# Altium footprint library Sensors.PcbLib: 30 footprints (part 2 of 2)
Each footprint in its own frame and in the unit in brackets; x right, y up, seen from the top. Pads: shape width x height; smd on the part's side, far side on the other; paste and mask are expansions set on the pad; w line width, h text height; cw(c..) or ccw(c..) is an arc to the next point about the centre after c.
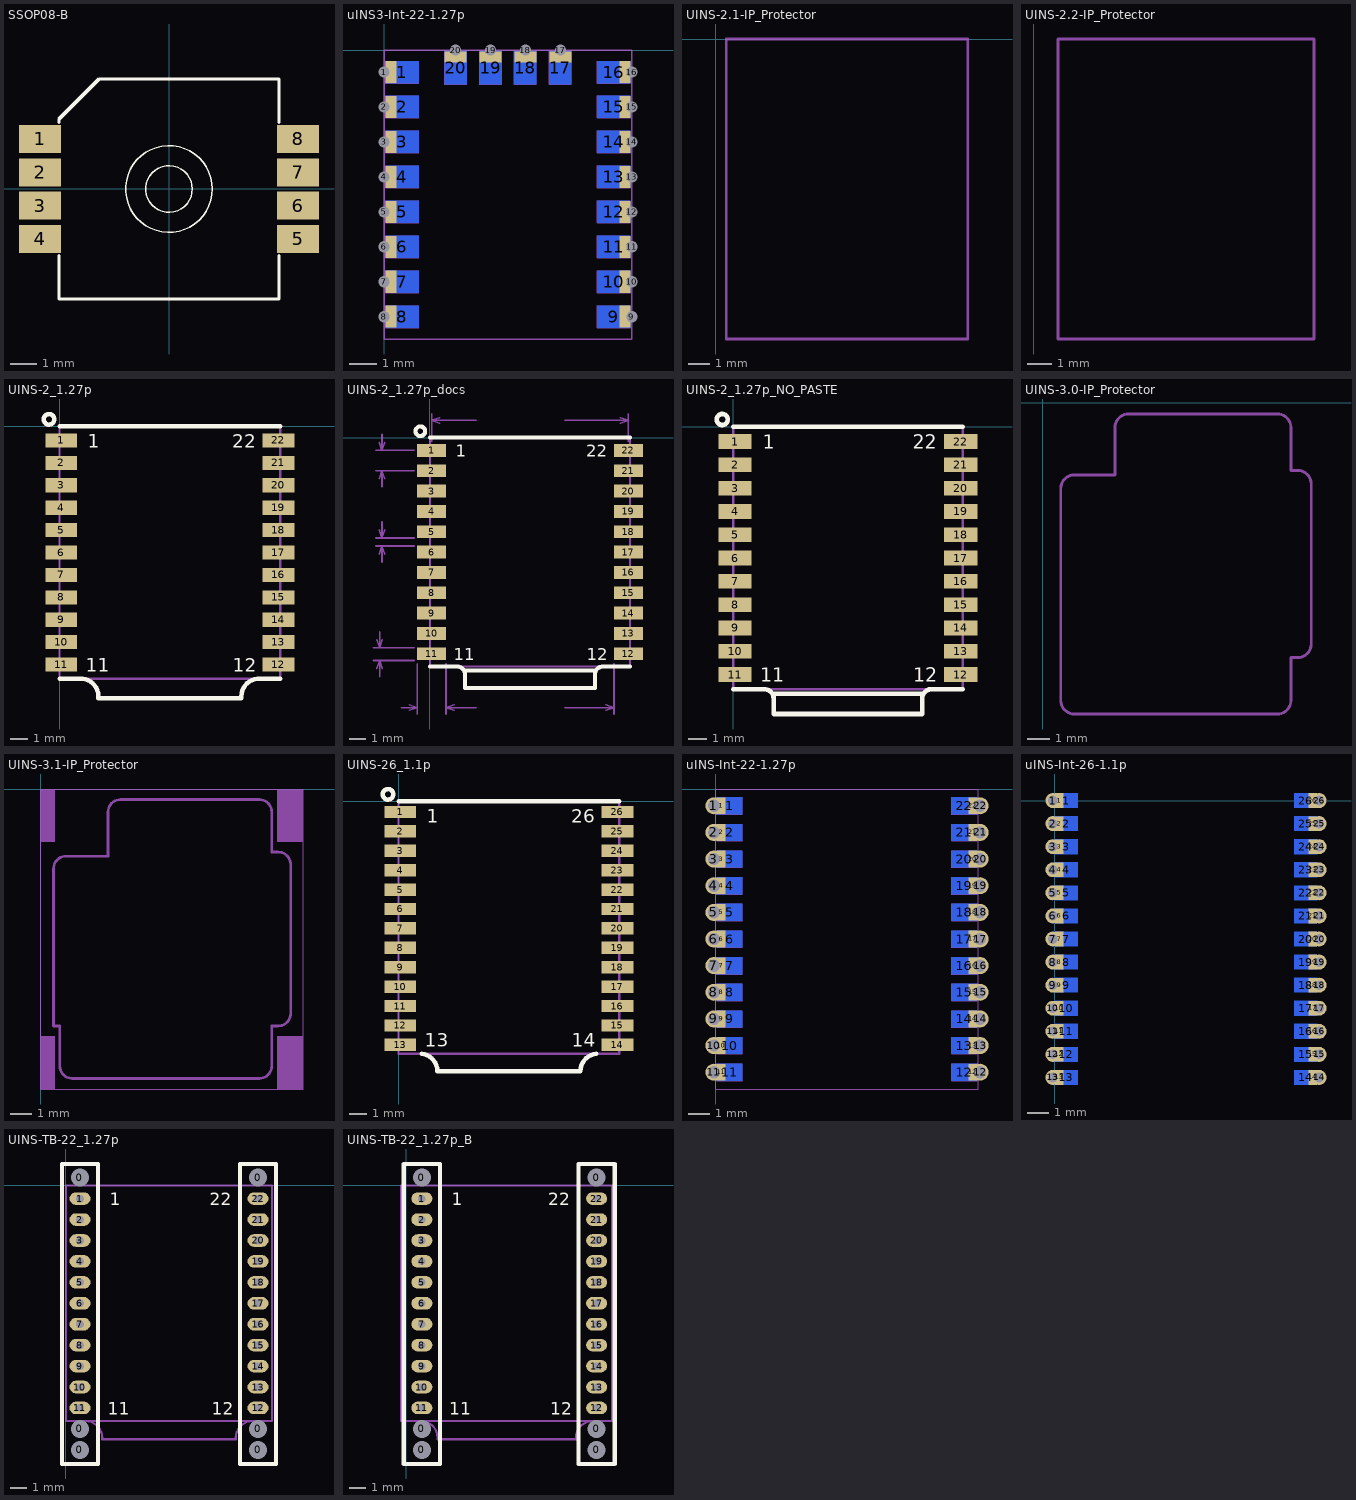
[diagram p1: the footprints below, top view; thin cyan lines are the x and y axes]

## SSOP08-B [mil] "Single Port Pressure Sensor"
pads (8):
  rect 63x42 smd paste-6.69 mask-6.3: 1(-193.5,75) 2(-193.5,25) 3(-193.5,-25) 4(-193.5,-75) 5(193.5,-75) 6(193.5,-25) 7(193.5,25) 8(193.5,75)
Top Overlay:
  circle w1.97: c0,0 r65
  circle w1.97: c0,0 r35
  lines w5: -165,-100 -165,-165 165,-165 165,-100 ; -165,100 -165,105 -105,165 165,165 165,100
3D body: height 190, standoff 0, extent -168.02,-168.02 168.02,168.02
3D body: height 380, standoff 0, extent -64.98,-64.98 64.98,64.98

## uINS3-Int-22-1.27p [mm] "uINS Interface, 22 pins 1.27mm pitch"
pads (40):
  rect 0.4x0.8 hole 0.406 copper offset 0.25,0: 1(0,-0.8) 2(0,-2.07) 3(0,-3.34) 4(0,-4.61) 5(0,-5.88) 6(0,-7.15) 7(0,-8.42) 8(0,-9.69)
  rect 1.2x0.8 smd far side paste-2: 1(0.65,-0.8) 2(0.65,-2.07) 3(0.65,-3.34) 4(0.65,-4.61) 5(0.65,-5.88) 6(0.65,-7.15) 7(0.65,-8.42) 8(0.65,-9.69) 9(8.35,-9.69) 10(8.35,-8.42) 11(8.35,-7.15) 12(8.35,-5.88) 13(8.35,-4.61) 14(8.35,-3.34) 15(8.35,-2.07) 16(8.35,-0.8)
  rect 0.4x0.8 hole 0.406 copper offset -0.25,0: 9(9,-9.69) 10(9,-8.42) 11(9,-7.15) 12(9,-5.88) 13(9,-4.61) 14(9,-3.34) 15(9,-2.07) 16(9,-0.8)
  rect 0.8x1.2 smd far side paste-2: 17(6.405,-0.65) 18(5.135,-0.65) 19(3.865,-0.65) 20(2.595,-0.65)
  rect 0.8x0.4 hole 0.406 copper offset 0,-0.25: 17(6.405,0) 18(5.135,0) 19(3.865,0) 20(2.595,0)
Mechanical 13:
  lines w0.05: 0,-10.5 0,0 9,0 9,-10.5 0,-10.5
Dimensions:
  lines w0.025: 0.05,-10.09 0.05,-9.89 ccw(c0,-9.69) 0.05,-9.49 0.05,-9.29 1.25,-9.29 1.25,-10.09 0.05,-10.09 ; 0.05,-8.82 1.25,-8.82 1.25,-8.02 0.05,-8.02 0.05,-8.22 cw(c0,-8.42) 0.05,-8.62 0.05,-8.82 ; 0.05,-7.55 1.25,-7.55 1.25,-6.75 0.05,-6.75 0.05,-6.95 cw(c0,-7.15) 0.05,-7.35 0.05,-7.55 ; 0.05,-6.28 1.25,-6.28 1.25,-5.48 0.05,-5.48 0.05,-5.68 cw(c0,-5.88) 0.05,-6.08 0.05,-6.28 ; 0.05,-5.01 1.25,-5.01 1.25,-4.21 0.05,-4.21 0.05,-4.41 cw(c0,-4.61) 0.05,-4.81 0.05,-5.01 ; 0.05,-3.74 1.25,-3.74 1.25,-2.94 0.05,-2.94 0.05,-3.14 cw(c0,-3.34) 0.05,-3.54 0.05,-3.74 ; 0.05,-2.47 1.25,-2.47 1.25,-1.67 0.05,-1.67 0.05,-1.87 cw(c0,-2.07) 0.05,-2.27 0.05,-2.47 ; 0.05,-1.2 0.05,-1 ccw(c0,-0.8) 0.05,-0.6 0.05,-0.4 1.25,-0.4 1.25,-1.2 0.05,-1.2 ; 2.195,-1.25 2.995,-1.25 2.995,-0.05 2.795,-0.05 cw(c2.595,0) 2.395,-0.05 2.195,-0.05 2.195,-1.25 ; 3.465,-1.25 4.265,-1.25 4.265,-0.05 4.065,-0.05 cw(c3.865,0) 3.665,-0.05 3.465,-0.05 3.465,-1.25 ; 4.735,-1.25 5.535,-1.25 5.535,-0.05 5.335,-0.05 cw(c5.135,0) 4.935,-0.05 4.735,-0.05 4.735,-1.25 ; 6.005,-1.25 6.005,-0.05 6.205,-0.05 ccw(c6.405,0) 6.605,-0.05 6.805,-0.05 6.805,-1.25 6.005,-1.25 ; 7.75,-10.09 7.75,-9.29 8.95,-9.29 8.95,-9.49 ccw(c9,-9.69) 8.95,-9.89 8.95,-10.09 7.75,-10.09 ; 7.75,-8.82 7.75,-8.02 8.95,-8.02 8.95,-8.22 ccw(c9,-8.42) 8.95,-8.62 8.95,-8.82 7.75,-8.82 ; 7.75,-7.55 7.75,-6.75 8.95,-6.75 8.95,-6.95 ccw(c9,-7.15) 8.95,-7.35 8.95,-7.55 7.75,-7.55 ; 7.75,-6.28 8.95,-6.28 8.95,-6.08 cw(c9,-5.88) 8.95,-5.68 8.95,-5.48 7.75,-5.48 7.75,-6.28 ; 7.75,-5.01 8.95,-5.01 8.95,-4.81 cw(c9,-4.61) 8.95,-4.41 8.95,-4.21 7.75,-4.21 7.75,-5.01 ; 7.75,-3.74 8.95,-3.74 8.95,-3.54 cw(c9,-3.34) 8.95,-3.14 8.95,-2.94 7.75,-2.94 7.75,-3.74 ; 7.75,-2.47 8.95,-2.47 8.95,-2.27 cw(c9,-2.07) 8.95,-1.87 8.95,-1.67 7.75,-1.67 7.75,-2.47 ; 7.75,-1.2 8.95,-1.2 8.95,-1 cw(c9,-0.8) 8.95,-0.6 8.95,-0.4 7.75,-0.4 7.75,-1.2

## UINS-2.1-IP_Protector [mm] "Inerial Sense Miniature INS IP Protector"
height 6.5
Mechanical 13:
  lines w0.127: 0.5,-14.3 0.5,0 1.7,0 10.8,0 12,0 12,-14.3 10.8,-14.3 0.5,-14.3
3D body: height 4, standoff 0, extent 0.501,-14.299 11.999,-0.001

## UINS-2.2-IP_Protector [mm] "Inerial Sense Miniature INS IP Protector"
height 6.5
Mechanical 13:
  lines w0.127: 1,-13.3 1,-1 11.5,-1 11.5,-13.3 1,-13.3
3D body: height 2.5, standoff 0, extent 1,-13.3 11.5,-1

## UINS-2_1.27p [mm] "Inerial Sense Miniature INS, 22pins 1.27mm pitch"
height 6.5
pads (22):
  rect 1.8x0.8 smd paste-0.1: 1(0.1,-0.8) 2(0.1,-2.07) 3(0.1,-3.34) 4(0.1,-4.61) 5(0.1,-5.88) 6(0.1,-7.15) 7(0.1,-8.42) 8(0.1,-9.69) 9(0.1,-10.96) 10(0.1,-12.23) 11(0.1,-13.5) 12(12.4,-13.5) 13(12.4,-12.23) 14(12.4,-10.96) 15(12.4,-9.69) 16(12.4,-8.42) 17(12.4,-7.15) 18(12.4,-5.88) 19(12.4,-4.61) 20(12.4,-3.34) 21(12.4,-2.07) 22(12.4,-0.8)
Top Overlay:
  circle w0.254: c-0.6,0.4 r0.3
  lines w0.254: 0,-14.3 1.3,-14.3 ; 0,0 12.5,0 ; 1.3,-14.305 cw(c1.2,-15.3) 2.2,-15.3 2.2,-15.4 10.3,-15.4 10.3,-15.3 cw(c11.3,-15.3) 11.2,-14.305 12.5,-14.305
  text "1" at 1.6,-1.2 h0.76
  text "11" at 1.473,-13.9 h0.76
  text "12" at 9.8,-13.9 h0.76
  text "22" at 9.773,-1.2 h0.76
Top Paste:
  rectangle: -0.8,-1.15 0,-0.45
  rectangle: -0.8,-2.42 0,-1.72
  rectangle: -0.8,-3.69 0,-2.99
  rectangle: -0.8,-4.96 0,-4.26
  rectangle: -0.8,-6.23 0,-5.53
  rectangle: -0.8,-7.5 0,-6.8
  rectangle: -0.8,-8.77 0,-8.07
  rectangle: -0.8,-10.04 0,-9.34
  rectangle: -0.8,-11.31 0,-10.61
  rectangle: -0.8,-12.58 0,-11.88
  rectangle: -0.8,-13.85 0,-13.15
  region: 13.3,-13.15 12.5,-13.15 12.5,-13.85 13.3,-13.85
  region: 13.3,-10.61 12.5,-10.61 12.5,-11.31 13.3,-11.31
  region: 13.3,-9.34 12.5,-9.34 12.5,-10.04 13.3,-10.04
  region: 13.3,-8.07 12.5,-8.07 12.5,-8.77 13.3,-8.77
  region: 13.3,-6.8 12.5,-6.8 12.5,-7.5 13.3,-7.5
  region: 13.3,-5.53 12.5,-5.53 12.5,-6.23 13.3,-6.23
  region: 13.3,-4.26 12.5,-4.26 12.5,-4.96 13.3,-4.96
  region: 13.3,-2.99 12.5,-2.99 12.5,-3.69 13.3,-3.69
  region: 13.3,-1.72 12.5,-1.72 12.5,-2.42 13.3,-2.42
  region: 13.3,-0.45 12.5,-0.45 12.5,-1.15 13.3,-1.15
  region: 13.3,-11.88 12.5,-11.88 12.5,-12.58 13.3,-12.58
Mechanical 13:
  lines w0.127: 0,-14.3 12.5,-14.3 ; 0,-14.3 0,0 12.5,0 12.5,-14.3 ; 0,-14.3 1.2,-14.3 cw(c1.2,-15.3) 2.2,-15.3 2.2,-15.4 10.3,-15.4 10.3,-15.3 cw(c11.3,-15.3) 11.3,-14.3 12.5,-14.3
3D body "uINS.step": height 6.62, standoff 0.01, extent 0,-15.4 12.5,0

## UINS-2_1.27p_docs [mm] "Inerial Sense Miniature INS, 22pins 1.27mm pitch"
height 6.5
pads (22):
  rect 1.8x0.8 smd paste-2: 1(0.1,-0.8) 2(0.1,-2.07) 3(0.1,-3.34) 4(0.1,-4.61) 5(0.1,-5.88) 6(0.1,-7.15) 7(0.1,-8.42) 8(0.1,-9.69) 9(0.1,-10.96) 10(0.1,-12.23) 11(0.1,-13.5) 12(12.4,-13.5) 13(12.4,-12.23) 14(12.4,-10.96) 15(12.4,-9.69) 16(12.4,-8.42) 17(12.4,-7.15) 18(12.4,-5.88) 19(12.4,-4.61) 20(12.4,-3.34) 21(12.4,-2.07) 22(12.4,-0.8)
Top Overlay:
  circle w0.254: c-0.6,0.4 r0.3
  lines w0.254: 0,-14.3 1.7,-14.3 cw(c1.7,-14.8) 2.2,-14.8 2.2,-15.65 10.3,-15.65 10.3,-14.8 cw(c10.8,-14.8) 10.75,-14.302 ; 0,0 12.5,0 ; 2.2,-14.55 10.3,-14.55 ; 10.8,-14.3 12.5,-14.3
  text "22" at 9.773,-1.2 h0.76
  text "12" at 9.8,-13.9 h0.76
  text "11" at 1.473,-13.9 h0.76
  text "1" at 1.6,-1.2 h0.76
Mechanical 13:
  lines w0.1: 1.2,-14.3 0,-14.3 ; 1.7,-14.3 cw(c1.7,-14.8) 2.2,-14.8 2.2,-15.65 10.3,-15.65 10.3,-14.8 cw(c10.8,-14.8) 10.8,-14.3 ; 2.2,-14.55 10.3,-14.55 ; 11.3,-14.3 12.5,-14.3 ; 0,-14.3 0,0 12.5,0 12.5,-14.3 ; 0,-14.3 12.5,-14.3
Dimensions:
  lines w0.1: -3.548,-13.923 -0.998,-13.923 ; -3.548,-13.123 -0.998,-13.123 ; -3.398,-6.773 -0.998,-6.773 ; -3.398,-6.273 -0.998,-6.273 ; -3.398,-2.07 -1,-2.07 ; -3.398,-0.8 -1,-0.8 ; -3.315,-14.423 -3.148,-13.923 ; -3.315,-12.623 -3.148,-13.123 ; -3.165,-7.273 -2.998,-6.773 ; -3.165,-5.773 -2.998,-6.273 ; -3.165,-2.57 -2.998,-2.07 ; -3.165,-0.3 -2.998,-0.8 ; -3.148,-14.923 -3.148,-13.923 ; -3.148,-12.123 -3.148,-13.123 ; -2.998,-7.773 -2.998,-6.773 ; -2.998,-5.273 -2.998,-6.273 ; -2.998,-3.07 -2.998,-2.07 ; -2.998,0.2 -2.998,-0.8 ; -2.981,-14.423 -3.148,-13.923 ; -2.981,-12.623 -3.148,-13.123 ; -2.831,-7.273 -2.998,-6.773 ; -2.831,-5.773 -2.998,-6.273 ; -2.831,-2.57 -2.998,-2.07 ; -2.831,-0.3 -2.998,-0.8 ; -1.798,-16.867 -0.798,-16.867 ; -1.298,-17.034 -0.798,-16.867 ; -1.298,-16.7 -0.798,-16.867 ; -0.798,-17.267 -0.798,-14.123 ; 0.1,-0.269 0.1,1.477 ; 0.6,0.91 0.1,1.077 ; 0.6,1.244 0.1,1.077 ; 1.002,-17.267 1.002,-15.623 ; 1.002,-15.767 1.002,-14.123 ; 2.002,-16.867 1.002,-16.867 ; 2.884,1.077 0.1,1.077 ; 2.886,-16.867 1.002,-16.867 ; 8.416,1.077 12.4,1.077 ; 8.418,-16.867 11.502,-16.867 ; 11.002,-17.034 11.502,-16.867 ; 11.002,-16.7 11.502,-16.867 ; 11.502,-17.267 11.502,-14.123 ; 11.9,0.91 12.4,1.077 ; 11.9,1.244 12.4,1.077 ; 12.4,-0.269 12.4,1.477 ; 1.002,-16.867 1.502,-17.034 1.002,-16.867 ; 1.002,-16.867 1.502,-16.7 1.002,-16.867
  text "0.50" at -4.198,-8.872 h1
  text "1.27" at -4.198,-3.701 h1
  text "1.80" at -2.164,-19.266 h1
  text "0.80" at -4.348,-15.872 h1
  text "12.30" at 3.484,0.477 h1
  text "10.50" at 3.486,-17.467 h1
3D body "uINS_no_passives(IS-uINS-r2.1.1).step": height 6.63, standoff 0.01, extent 0,-15.74 12.5,0

## UINS-2_1.27p_NO_PASTE [mm] "Inerial Sense Miniature INS, 22pins 1.27mm pitch"
height 6.5
pads (22):
  rect 1.8x0.8 smd paste-2: 1(0.1,-0.8) 2(0.1,-2.07) 3(0.1,-3.34) 4(0.1,-4.61) 5(0.1,-5.88) 6(0.1,-7.15) 7(0.1,-8.42) 8(0.1,-9.69) 9(0.1,-10.96) 10(0.1,-12.23) 11(0.1,-13.5) 12(12.4,-13.5) 13(12.4,-12.23) 14(12.4,-10.96) 15(12.4,-9.69) 16(12.4,-8.42) 17(12.4,-7.15) 18(12.4,-5.88) 19(12.4,-4.61) 20(12.4,-3.34) 21(12.4,-2.07) 22(12.4,-0.8)
Top Overlay:
  circle w0.254: c-0.6,0.4 r0.3
  lines w0.254: 0,-14.3 1.7,-14.3 cw(c1.7,-14.8) 2.2,-14.8 2.2,-15.65 10.3,-15.65 10.3,-14.8 cw(c10.8,-14.8) 10.75,-14.302 ; 0,0 12.5,0 ; 2.2,-14.55 10.3,-14.55 ; 10.8,-14.3 12.5,-14.3
  text "1" at 1.6,-1.2 h0.76
  text "11" at 1.473,-13.9 h0.76
  text "12" at 9.8,-13.9 h0.76
  text "22" at 9.773,-1.2 h0.76
Mechanical 13:
  lines w0.127: 1.2,-14.3 0,-14.3 ; 1.7,-14.3 cw(c1.7,-14.8) 2.2,-14.8 2.2,-15.65 10.3,-15.65 10.3,-14.8 cw(c10.8,-14.8) 10.8,-14.3 ; 2.2,-14.55 10.3,-14.55 ; 11.3,-14.3 12.5,-14.3 ; 0,-14.3 12.5,-14.3 ; 0,-14.3 0,0 12.5,0 12.5,-14.3
3D body "uINS_no_passives(IS-uINS-r2.1.1).step": height 6.63, standoff 0.01, extent 0,-15.74 12.5,0

## UINS-3.0-IP_Protector [mm] "Inerial Sense Miniature INS IP Protector"
height 2
Mechanical 13:
  lines w0.127: 0.8,-13.2 ccw(c1.4,-13.2) 1.4,-13.8 10.4,-13.8 ccw(c10.4,-13.2) 11,-13.2 11,-11.3 11.3,-11.3 ccw(c11.3,-10.7) 11.9,-10.7 11.9,-3.6 ccw(c11.3,-3.6) 11.3,-3 11,-3 11,-1.1 ccw(c10.4,-1.1) 10.4,-0.5 3.8,-0.5 ccw(c3.8,-1.1) 3.2,-1.1 3.2,-3.2 1.4,-3.2 ccw(c1.4,-3.8) 0.8,-3.8 0.8,-13.2
3D body: height 2, standoff 0, extent 0.799,-13.801 11.901,-0.499

## UINS-3.1-IP_Protector [mm] "Inerial Sense Miniature INS IP Protector"
height 2
Mechanical 13:
  region: 0,-11.785 0,-14.3 0.66,-14.3 0.66,-11.785
  region: 0.66,-2.515 0.66,0 0,0 0,-2.515
  region: 11.255,0 11.255,-2.515 12.5,-2.515 12.5,0
  region: 11.255,-11.785 11.255,-14.3 12.5,-14.3 12.5,-11.785
  lines w0.051: 0,-14.3 0,0 12.5,0 12.5,-14.3 0,-14.3
  lines w0.127: 0.6,-11.3 0.6,-3.8 cw(c1.2,-3.8) 1.2,-3.2 3.2,-3.2 3.2,-1.1 cw(c3.8,-1.1) 3.8,-0.5 10.4,-0.5 cw(c10.4,-1.1) 11,-1.1 11,-3 11.3,-3 cw(c11.3,-3.6) 11.9,-3.6 11.9,-10.7 cw(c11.3,-10.7) 11.3,-11.3 11,-11.3 11,-13.2 cw(c10.4,-13.2) 10.4,-13.8 1.5,-13.8 cw(c1.5,-13.2) 0.9,-13.2 0.9,-11.6 0.9,-11.3 0.6,-11.3
3D body: height 2, standoff 0, extent 0.599,-13.801 11.901,-0.499

## UINS-26_1.1p [mm] "Inerial Sense Miniature INS, 26 pins 1.1mm pitch"
height 6.5
pads (26):
  rect 1.8x0.7 smd paste-0.1: 1(0.1,-0.6) 14(12.4,-13.8) 15(12.4,-12.7) 16(12.4,-11.6) 17(12.4,-10.5) 18(12.4,-9.4) 19(12.4,-8.3) 20(12.4,-7.2) 21(12.4,-6.1) 22(12.4,-5) 23(12.4,-3.9) 24(12.4,-2.8) 25(12.4,-1.7) 26(12.4,-0.6)
  rect 1.8x0.7 smd paste-2: 2(0.1,-1.7) 3(0.1,-2.8) 4(0.1,-3.9) 5(0.1,-5) 6(0.1,-6.1) 7(0.1,-7.2) 8(0.1,-8.3) 9(0.1,-9.4) 10(0.1,-10.5) 11(0.1,-11.6) 12(0.1,-12.7) 13(0.1,-13.8)
Top Overlay:
  circle w0.254: c-0.6,0.4 r0.3
  lines w0.254: 0,0 12.5,0 ; 1.3,-14.305 cw(c1.2,-15.3) 2.2,-15.3 10.3,-15.3 cw(c11.3,-15.3) 11.2,-14.305
  text "26" at 9.773,-1.2 h0.76
  text "14" at 9.8,-13.9 h0.76
  text "13" at 1.473,-13.9 h0.76
  text "1" at 1.6,-1.2 h0.76
Top Paste:
  region: 13.3,-0.25 12.5,-0.25 12.5,-0.95 13.3,-0.95
  region: 13.3,-1.35 12.5,-1.35 12.5,-2.05 13.3,-2.05
  rectangle: 0,-14.05 0.9,-13.55
  rectangle: -0.8,-14.15 0,-13.45
  region: 13.3,-2.45 12.5,-2.45 12.5,-3.15 13.3,-3.15
  region: 13.3,-3.55 12.5,-3.55 12.5,-4.25 13.3,-4.25
  region: 13.3,-4.65 12.5,-4.65 12.5,-5.35 13.3,-5.35
  region: 13.3,-5.75 12.5,-5.75 12.5,-6.45 13.3,-6.45
  region: 13.3,-6.85 12.5,-6.85 12.5,-7.55 13.3,-7.55
  region: 13.3,-7.95 12.5,-7.95 12.5,-8.65 13.3,-8.65
  region: 13.3,-9.05 12.5,-9.05 12.5,-9.75 13.3,-9.75
  region: 13.3,-10.15 12.5,-10.15 12.5,-10.85 13.3,-10.85
  region: 13.3,-11.25 12.5,-11.25 12.5,-11.95 13.3,-11.95
  region: 13.3,-12.35 12.5,-12.35 12.5,-13.05 13.3,-13.05
  region: 13.3,-13.45 12.5,-13.45 12.5,-14.15 13.3,-14.15
  rectangle: -0.8,-13.05 0,-12.35
  rectangle: 0,-12.95 0.9,-12.45
  rectangle: -0.8,-11.95 0,-11.25
  rectangle: 0,-11.85 0.9,-11.35
  rectangle: -0.8,-10.85 0,-10.15
  rectangle: 0,-10.75 0.9,-10.25
  rectangle: -0.8,-9.75 0,-9.05
  rectangle: 0,-9.65 0.9,-9.15
  rectangle: -0.8,-8.65 0,-7.95
  rectangle: 0,-8.55 0.9,-8.05
  rectangle: -0.8,-7.55 0,-6.85
  rectangle: 0,-7.45 0.9,-6.95
  rectangle: -0.8,-6.45 0,-5.75
  rectangle: 0,-6.35 0.9,-5.85
  rectangle: -0.8,-5.35 0,-4.65
  rectangle: 0,-5.25 0.9,-4.75
  rectangle: -0.8,-4.25 0,-3.55
  rectangle: 0,-4.15 0.9,-3.65
  rectangle: -0.8,-3.15 0,-2.45
  rectangle: 0,-3.05 0.9,-2.55
  rectangle: -0.8,-2.05 0,-1.35
  rectangle: 0,-1.95 0.9,-1.45
  rectangle: -0.8,-0.95 0,-0.25
Mechanical 13:
  lines w0.127: 0,-14.3 1.2,-14.3 cw(c1.2,-15.3) 2.2,-15.3 10.3,-15.3 cw(c11.3,-15.3) 11.3,-14.3 12.5,-14.3 ; 0,-14.3 0,0 12.5,0 12.5,-14.3 ; 0,-14.3 12.5,-14.3

## uINS-Int-22-1.27p [mm] "uINS Interface, 22 pins 1.27mm pitch"
pads (66):
  round 0.813 hole 0.584 mask-0.051: 1(-0.09,-0.8) 2(-0.09,-2.07) 3(-0.09,-3.34) 4(-0.09,-4.61) 5(-0.09,-5.88) 6(-0.09,-7.15) 7(-0.09,-8.42) 8(-0.09,-9.69) 9(-0.09,-10.96) 10(-0.09,-12.23) 11(-0.09,-13.5) 12(12.59,-13.5) 13(12.59,-12.23) 14(12.59,-10.96) 15(12.59,-9.69) 16(12.59,-8.42) 17(12.59,-7.15) 18(12.59,-5.88) 19(12.59,-4.61) 20(12.59,-3.34) 21(12.59,-2.07) 22(12.59,-0.8)
  rect 0.4x0.8 smd paste-2 mask+0.038: 1(0.25,-0.8) 2(0.25,-2.07) 3(0.25,-3.34) 4(0.25,-4.61) 5(0.25,-5.88) 6(0.25,-7.15) 7(0.25,-8.42) 8(0.25,-9.69) 9(0.25,-10.96) 10(0.25,-12.23) 11(0.25,-13.5) 12(12.25,-13.5) 13(12.25,-12.23) 14(12.25,-10.96) 15(12.25,-9.69) 16(12.25,-8.42) 17(12.25,-7.15) 18(12.25,-5.88) 19(12.25,-4.61) 20(12.25,-3.34) 21(12.25,-2.07) 22(12.25,-0.8)
  rect 1.2x0.8 smd far side paste-2: 1(0.65,-0.8) 2(0.65,-2.07) 3(0.65,-3.34) 4(0.65,-4.61) 5(0.65,-5.88) 6(0.65,-7.15) 7(0.65,-8.42) 8(0.65,-9.69) 9(0.65,-10.96) 10(0.65,-12.23) 11(0.65,-13.5) 12(11.85,-13.5) 13(11.85,-12.23) 14(11.85,-10.96) 15(11.85,-9.69) 16(11.85,-8.42) 17(11.85,-7.15) 18(11.85,-5.88) 19(11.85,-4.61) 20(11.85,-3.34) 21(11.85,-2.07) 22(11.85,-0.8)
Mechanical 13:
  lines w0.05: 0,-14.3 0,0 12.5,0 12.5,-14.3 0,-14.3
Dimensions:
  lines w0.025: 0.05,-13.9 0.05,-13.7 ccw(c0,-13.5) 0.05,-13.3 0.05,-13.1 1.25,-13.1 1.25,-13.9 0.05,-13.9 ; 0.05,-12.63 0.05,-12.43 ccw(c0,-12.23) 0.05,-12.03 0.05,-11.83 1.25,-11.83 1.25,-12.63 0.05,-12.63 ; 0.05,-11.36 0.05,-11.16 ccw(c0,-10.96) 0.05,-10.76 0.05,-10.56 1.25,-10.56 1.25,-11.36 0.05,-11.36 ; 0.05,-10.09 0.05,-9.89 ccw(c0,-9.69) 0.05,-9.49 0.05,-9.29 1.25,-9.29 1.25,-10.09 0.05,-10.09 ; 0.05,-8.82 0.05,-8.62 ccw(c0,-8.42) 0.05,-8.22 0.05,-8.02 1.25,-8.02 1.25,-8.82 0.05,-8.82 ; 0.05,-7.55 0.05,-7.35 ccw(c0,-7.15) 0.05,-6.95 0.05,-6.75 1.25,-6.75 1.25,-7.55 0.05,-7.55 ; 0.05,-6.28 0.05,-6.08 ccw(c0,-5.88) 0.05,-5.68 0.05,-5.48 1.25,-5.48 1.25,-6.28 0.05,-6.28 ; 0.05,-5.01 0.05,-4.81 ccw(c0,-4.61) 0.05,-4.41 0.05,-4.21 1.25,-4.21 1.25,-5.01 0.05,-5.01 ; 0.05,-3.74 0.05,-3.54 ccw(c0,-3.34) 0.05,-3.14 0.05,-2.94 1.25,-2.94 1.25,-3.74 0.05,-3.74 ; 0.05,-2.47 0.05,-2.27 ccw(c0,-2.07) 0.05,-1.87 0.05,-1.67 1.25,-1.67 1.25,-2.47 0.05,-2.47 ; 0.05,-1.2 0.05,-1 ccw(c0,-0.8) 0.05,-0.6 0.05,-0.4 1.25,-0.4 1.25,-1.2 0.05,-1.2 ; 11.25,-13.9 11.25,-13.1 12.45,-13.1 12.45,-13.3 ccw(c12.5,-13.5) 12.45,-13.7 12.45,-13.9 11.25,-13.9 ; 11.25,-12.63 11.25,-11.83 12.45,-11.83 12.45,-12.03 ccw(c12.5,-12.23) 12.45,-12.43 12.45,-12.63 11.25,-12.63 ; 11.25,-11.36 11.25,-10.56 12.45,-10.56 12.45,-10.76 ccw(c12.5,-10.96) 12.45,-11.16 12.45,-11.36 11.25,-11.36 ; 11.25,-10.09 11.25,-9.29 12.45,-9.29 12.45,-9.49 ccw(c12.5,-9.69) 12.45,-9.89 12.45,-10.09 11.25,-10.09 ; 11.25,-8.82 11.25,-8.02 12.45,-8.02 12.45,-8.22 ccw(c12.5,-8.42) 12.45,-8.62 12.45,-8.82 11.25,-8.82 ; 11.25,-7.55 11.25,-6.75 12.45,-6.75 12.45,-6.95 ccw(c12.5,-7.15) 12.45,-7.35 12.45,-7.55 11.25,-7.55 ; 11.25,-6.28 11.25,-5.48 12.45,-5.48 12.45,-5.68 ccw(c12.5,-5.88) 12.45,-6.08 12.45,-6.28 11.25,-6.28 ; 11.25,-5.01 11.25,-4.21 12.45,-4.21 12.45,-4.41 ccw(c12.5,-4.61) 12.45,-4.81 12.45,-5.01 11.25,-5.01 ; 11.25,-3.74 12.45,-3.74 12.45,-3.54 cw(c12.5,-3.34) 12.45,-3.14 12.45,-2.94 11.25,-2.94 11.25,-3.74 ; 11.25,-2.47 11.25,-1.67 12.45,-1.67 12.45,-1.87 ccw(c12.5,-2.07) 12.45,-2.27 12.45,-2.47 11.25,-2.47 ; 11.25,-1.2 11.25,-0.4 12.45,-0.4 12.45,-0.6 ccw(c12.5,-0.8) 12.45,-1 12.45,-1.2 11.25,-1.2

## uINS-Int-26-1.1p [mm] "uINS Interface, 26 pins 1.1mm pitch"
pads (78):
  round 0.711 hole 0.457: 1(-0.1,0) 2(-0.1,-1.1) 3(-0.1,-2.2) 4(-0.1,-3.3) 5(-0.1,-4.4) 6(-0.1,-5.5) 7(-0.1,-6.6) 8(-0.1,-7.7) 9(-0.1,-8.8) 10(-0.1,-9.9) 11(-0.1,-11) 12(-0.1,-12.1) 13(-0.1,-13.2) 14(12.6,-13.2) 15(12.6,-12.1) 16(12.6,-11) 17(12.6,-9.9) 18(12.6,-8.8) 19(12.6,-7.7) 20(12.6,-6.6) 21(12.6,-5.5) 22(12.6,-4.4) 23(12.6,-3.3) 24(12.6,-2.2) 25(12.6,-1.1) 26(12.6,0)
  rect 0.4x0.7 smd: 1(0.2,0) 2(0.2,-1.1) 3(0.2,-2.2) 4(0.2,-3.3) 5(0.2,-4.4) 6(0.2,-5.5) 7(0.2,-6.6) 8(0.2,-7.7) 9(0.2,-8.8) 10(0.2,-9.9) 11(0.2,-11) 12(0.2,-12.1) 13(0.2,-13.2) 14(12.3,-13.2) 15(12.3,-12.1) 16(12.3,-11) 17(12.3,-9.9) 18(12.3,-8.8) 19(12.3,-7.7) 20(12.3,-6.6) 21(12.3,-5.5) 22(12.3,-4.4) 23(12.3,-3.3) 24(12.3,-2.2) 25(12.3,-1.1) 26(12.3,0)
  rect 1.1x0.7 smd far side: 1(0.55,0) 2(0.55,-1.1) 3(0.55,-2.2) 4(0.55,-3.3) 5(0.55,-4.4) 6(0.55,-5.5) 7(0.55,-6.6) 8(0.55,-7.7) 9(0.55,-8.8) 10(0.55,-9.9) 11(0.55,-11) 12(0.55,-12.1) 13(0.55,-13.2) 14(11.95,-13.2) 15(11.95,-12.1) 16(11.95,-11) 17(11.95,-9.9) 18(11.95,-8.8) 19(11.95,-7.7) 20(11.95,-6.6) 21(11.95,-5.5) 22(11.95,-4.4) 23(11.95,-3.3) 24(11.95,-2.2) 25(11.95,-1.1) 26(11.95,0)

## UINS-TB-22_1.27p [mil] "Inerial Sense Miniature INS Testbed, 22pins 1.27mm pitch"
height 246.85
pads (28):
  round 31.5 hole 43.31 unplated: 0(33.47,-631.5) 0(33.47,-581.5) 0(33.47,18.5) 0(458.66,-631.5) 0(458.66,-581.5) 0(458.66,18.5)
  oval 50x30 / inner round 30 / far side oval 50x30 hole 18: 1(33.47,-31.5) 2(33.47,-81.5) 3(33.47,-131.5) 4(33.47,-181.5) 5(33.47,-231.5) 6(33.47,-281.5) 7(33.47,-331.5) 8(33.47,-381.5) 9(33.47,-431.5) 10(33.47,-481.5) 11(33.47,-531.5) 12(458.66,-531.5) 13(458.66,-481.5) 14(458.66,-431.5) 15(458.66,-381.5) 16(458.66,-331.5) 17(458.66,-281.5) 18(458.66,-231.5) 19(458.66,-181.5) 20(458.66,-131.5) 21(458.66,-81.5) 22(458.66,-31.5)
Top Overlay:
  lines w10: -9.84,-665.36 -9.84,51.18 76.77,51.18 76.77,-665.36 -9.84,-665.36 ; 415.36,-665.36 415.36,51.18 501.97,51.18 501.97,-665.36 415.36,-665.36
  text "1" at 104.33,-47.25 h30
  text "11" at 99.33,-547.25 h30
  text "12" at 348.43,-547.25 h30
  text "22" at 343.43,-47.25 h30
Mechanical 13:
  lines w5: 0,-562.99 492.13,-562.99 ; 0,-562.99 0,0 492.13,0 492.13,-562.99 ; 0,-562.99 47.24,-562.99 cw(c47.24,-602.36) 86.62,-602.36 86.61,-606.3 405.51,-606.3 405.51,-602.36 cw(c444.88,-602.36) 444.88,-562.99 492.13,-562.99
3D body "mill-max-P854-22-012-10-001101.step": height 247.48, standoff -102.52, extent 415.24,-664.04 502.24,50.95
3D body "mill-max-P854-22-012-10-001101.step": height 247.48, standoff -102.52, extent -9.96,-664.04 77.04,50.95
3D body "uINS(IS-uINS-r2.1.1).step": height 474.06, standoff 213.6, extent 0,-619.67 492.13,0

## UINS-TB-22_1.27p_B [mil] "Inerial Sense Miniature INS Testbed, 22pins 1.27mm pitch"
height 246.85
pads (28):
  round 31.5 hole 43.31 unplated: 0(37.4,-631.5) 0(37.4,-581.5) 0(37.4,18.5) 0(454.73,-631.5) 0(454.73,-581.5) 0(454.73,18.5)
  oval 50x30 / inner round 30 / far side oval 50x30 hole 18: 1(37.4,-31.5) 2(37.4,-81.5) 3(37.4,-131.5) 4(37.4,-181.5) 5(37.4,-231.5) 6(37.4,-281.5) 7(37.4,-331.5) 8(37.4,-381.5) 9(37.4,-431.5) 10(37.4,-481.5) 11(37.4,-531.5) 12(454.73,-531.5) 13(454.73,-481.5) 14(454.73,-431.5) 15(454.73,-381.5) 16(454.73,-331.5) 17(454.73,-281.5) 18(454.73,-231.5) 19(454.73,-181.5) 20(454.73,-131.5) 21(454.73,-81.5) 22(454.73,-31.5)
Top Overlay:
  lines w10: -5.9,-665.36 80.71,-665.36 80.71,51.18 -5.9,51.18 -5.9,-665.36 ; 411.42,-665.36 498.03,-665.36 498.03,51.18 411.42,51.18 411.42,-665.36
  text "22" at 339.49,-47.25 h30
  text "12" at 344.49,-547.25 h30
  text "1" at 108.27,-47.25 h30
  text "11" at 103.27,-547.25 h30
Mechanical 13:
  lines w5: -11.81,-562.99 492.13,-562.99 ; -11.81,-562.99 35.43,-562.99 cw(c35.43,-602.36) 74.8,-602.36 74.8,-606.3 405.51,-606.3 405.51,-602.36 cw(c444.88,-602.36) 444.88,-562.99 492.13,-562.99 ; -11.81,-562.99 -11.81,0 492.13,0 492.13,-562.99
3D body "mill-max-P854-22-012-10-001101.step": height 247.48, standoff -102.52, extent 411.3,-664.04 498.3,50.95
3D body "mill-max-P854-22-012-10-001101.step": height 247.48, standoff -102.52, extent -6.02,-664.04 80.98,50.95
3D body "uINS-3p1-G2_internal.step": height 387.6, standoff 151.75, extent 0,-632.25 492.12,0